# Altium footprint library HoangLong_Library.PcbLib: 81 footprints (part 5 of 6)
Each footprint in its own frame and in the unit in brackets; x right, y up, seen from the top. Pads: shape width x height; smd on the part's side, far side on the other; paste and mask are expansions set on the pad; w line width, h text height; cw(c..) or ccw(c..) is an arc to the next point about the centre after c.
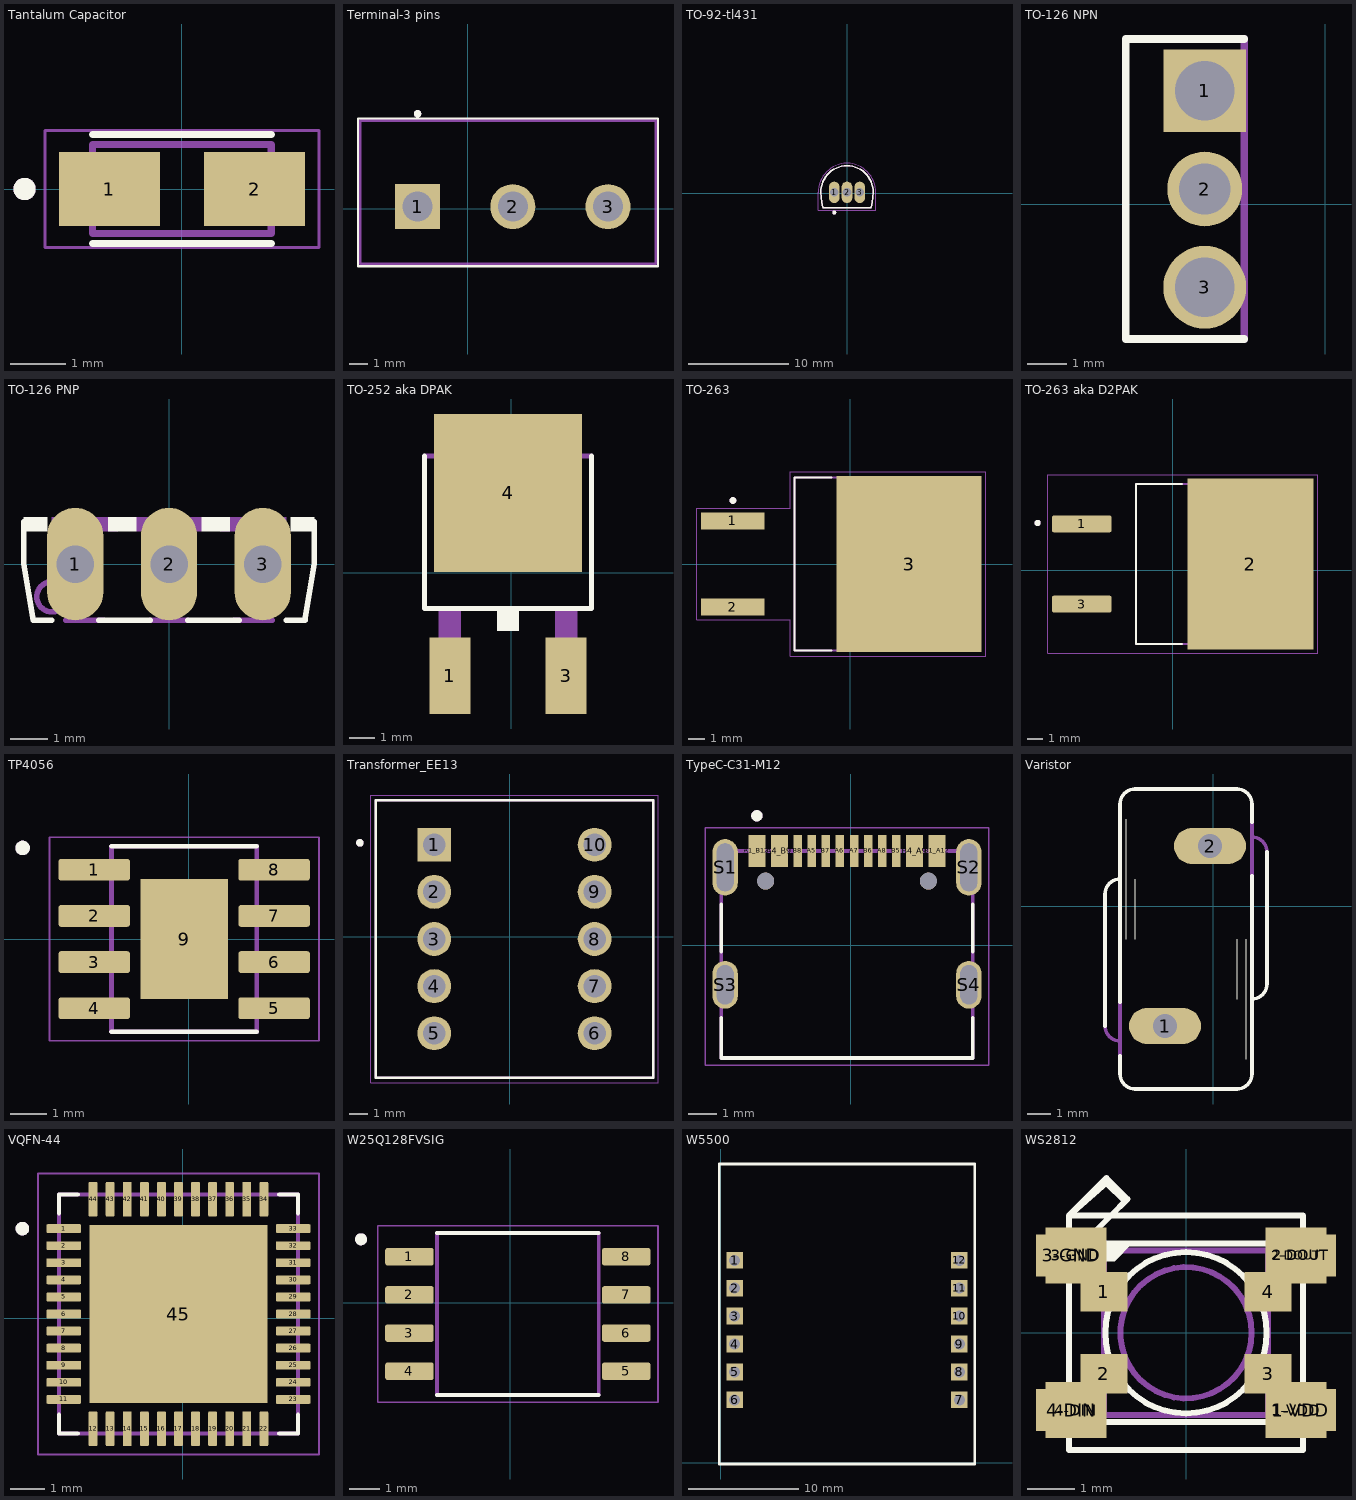
[diagram p4: the footprints below, top view; thin cyan lines are the x and y axes]

## Tantalum Capacitor [mm]
pads (2):
  rect 1.81x1.32 smd: 1(-1.3,0) 2(1.3,0)
Top Overlay:
  circle w0.2: c-2.82,0 r0.1
  lines w0.127: -1.6,-0.98 1.6,-0.98 ; -1.6,0.98 1.6,0.98
Mechanical 13:
  circle w0.2: c-2.82,0 r0.1
  lines w0.127: -1.6,-0.8 -1.6,0.8 1.6,0.8 1.6,-0.8 -1.6,-0.8
Mechanical 15:
  lines w0.051: -2.455,-1.05 2.455,-1.05 2.455,1.05 -2.455,1.05 -2.455,-1.05
3D body "TPSA225K010R1800.STEP": height 1.8, standoff 0, extent -1.6,-0.762 1.6,0.838

## Terminal-3 pins [mm]
pads (3):
  rect 2.4x2.4 / inner round 2.4 / far side rect 2.4x2.4 hole 1.6: 1(-2.667,0.127)
  round 2.4 hole 1.6: 2(2.413,0.127) 3(7.493,0.127)
Top Overlay:
  circle w0.2: c-2.667,5.08 r0.1
  lines w0.127: -5.842,-3.048 -5.842,4.826 10.16,4.826 10.16,-3.048 -5.842,-3.048
Mechanical 13:
  circle w0.2: c-2.667,5.08 r0.1
  lines w0.127: -5.715,-2.921 10.033,-2.921 10.033,4.699 -5.715,4.699 -5.715,-2.921
Mechanical 15:
  lines w0.05: -5.842,-3.048 -5.842,4.826 10.16,4.826 10.16,-3.048 -5.842,-3.048
3D body "DG306-5.0-03P-12-00AH.STEP": height 10.2, standoff -3.7, extent -5.641,-2.921 9.959,4.679

## TO-92-tl431 [mm]
pads (3):
  oval 1.07x2.14 hole 0.85: 1(-1.27,0.06) 2(0,0.06) 3(1.27,0.06)
Top Overlay:
  circle w0.2: c-1.27,-1.94 r0.1
  lines w0.127: -2.606,0.093 ccw(c6.178,0.4) -2.42,-1.427 ; -2.605,0.046 cw(c0.032,0.092) -0.014,2.73 ; -2.412,-1.46 2.412,-1.46 ; 0.014,2.73 cw(c-0.032,0.092) 2.605,0.046 ; 2.42,-1.427 ccw(c-6.178,0.4) 2.606,0.093
Mechanical 13:
  circle w0.2: c-1.27,-1.94 r0.1
  lines w0.127: -2.606,0.093 ccw(c6.178,0.4) -2.42,-1.427 ; -2.605,0.046 cw(c0.032,0.092) -0.014,2.73 ; -2.412,-1.46 2.412,-1.46 ; 0.014,2.73 cw(c-0.032,0.092) 2.605,0.046 ; 2.42,-1.427 ccw(c-6.178,0.4) 2.606,0.093
Mechanical 15:
  lines w0.05: -2.855,0.042 cw(c0.032,0.092) -0.018,2.98 ; -2.855,0.06 -2.855,-1.71 2.855,-1.71 2.855,0.06 ; 0.018,2.98 cw(c-0.032,0.092) 2.855,0.042
3D body "step_temp.STEP": height 5.33, standoff -12.7, extent -2.6,-1.465 2.6,2.728

## TO-126 NPN [mm]
pads (3):
  rect 2.1x2.1 / inner round 2.1 / far side rect 2.1x2.1 hole 1.5: 1(-3.048,2.871)
  round 1.9 hole 1.3: 2(-3.048,0.381)
  round 2.1 hole 1.5: 3(-3.048,-2.109)
Top Overlay:
  lines w0.2: -2.048,-3.419 -5.048,-3.419 -5.048,4.181 -2.048,4.181
Mechanical 13:
  lines w0.2: -2.048,-3.419 -2.048,4.181
3D body "step_temp.STEP": height 17.45, standoff -10.28, extent -4.478,-3.419 -1.778,4.181

## TO-126 PNP [mil]
pads (3):
  oval 60x120 hole 40: 1(-100,0) 2(0,0) 3(100,0)
Top Overlay:
  region: -130,35 -155,35 -155,50 -130,50
  region: -35,35 -65,35 -65,50 -35,50
  region: 65,35 35,35 35,50 65,50
  region: 155,35 130,35 130,50 155,50
  lines w6: -155,45 -155,0 -145,-60 -125,-60 ; -75,-60 -20,-60 ; 20,-60 75,-60 ; 125,-60 145,-60 155,0 155,45
Mechanical 13:
  circle w6: c-125,-35 r16
  region: -55,35 -125,35 -125,50 -55,50
  region: 35,35 -35,35 -35,50 35,50
  region: 125,35 55,35 55,50 125,50
  lines w6: -110,-60 -70,-60 ; -20,-60 20,-60 ; 70,-60 110,-60
3D body "step_temp.STEP": height 687.01, standoff -404.72, extent -149.61,-63.15 149.61,43.15

## TO-252 aka DPAK [mm]
pads (3):
  rect 1.6x3 smd: 1(-2.407,-4.038) 3(2.153,-4.038)
  rect 5.8x6.2 smd: 4(-0.127,3.142)
Top Overlay:
  region: 0.305,-2.261 -0.559,-2.261 -0.559,-1.499 0.305,-1.499
  lines w0.203: -3.404,4.597 -3.404,-1.397 3.15,-1.397 3.15,4.597
Mechanical 13:
  region: 2.438,5.41 2.438,4.699 -2.692,4.699 -2.692,5.41 -2.235,5.867 1.981,5.867
  region: 2.591,-4.394 1.727,-4.394 1.727,-1.499 2.591,-1.499
  region: -1.981,-4.394 -2.845,-4.394 -2.845,-1.499 -1.981,-1.499
  lines w0.203: -3.404,4.597 3.15,4.597 ; -2.692,4.699 2.438,4.699 2.438,5.41 1.981,5.867 -2.235,5.867 -2.692,5.41 -2.692,4.699
3D body "step_temp.STEP": height 2.4, standoff 0, extent -3.377,-4.064 3.123,5.661

## TO-263 [mm]
pads (3):
  rect 3.74x1.02 smd: 1(-6.918,2.54) 2(-6.918,-2.54)
  rect 8.56x10.37 smd paste-6: 3(3.492,0)
Top Overlay:
  circle w0.2: c-6.918,3.75 r0.1
  lines w0.127: -1.101,-5.1 -3.28,-5.1 -3.28,5.1 -1.101,5.1
Top Paste:
  region: 7.342,-0.695 6.062,-0.695 6.062,0.695 7.342,0.695
  region: 7.342,1.385 6.062,1.385 6.062,2.775 7.342,2.775
  region: 7.342,3.465 6.062,3.465 6.062,4.855 7.342,4.855
  region: 7.342,-2.775 6.062,-2.775 6.062,-1.385 7.342,-1.385
  region: 7.342,-4.855 6.062,-4.855 6.062,-3.465 7.342,-3.465
  region: 5.202,-0.695 3.922,-0.695 3.922,0.695 5.202,0.695
  region: 5.202,1.385 3.922,1.385 3.922,2.775 5.202,2.775
  region: 5.202,3.465 3.922,3.465 3.922,4.855 5.202,4.855
  region: 5.202,-2.775 3.922,-2.775 3.922,-1.385 5.202,-1.385
  region: 5.202,-4.855 3.922,-4.855 3.922,-3.465 5.202,-3.465
  region: 3.062,-0.695 1.782,-0.695 1.782,0.695 3.062,0.695
  region: 3.062,1.385 1.782,1.385 1.782,2.775 3.062,2.775
  region: 3.062,3.465 1.782,3.465 1.782,4.855 3.062,4.855
  region: 3.062,-2.775 1.782,-2.775 1.782,-1.385 3.062,-1.385
  region: 3.062,-4.855 1.782,-4.855 1.782,-3.465 3.062,-3.465
  region: 0.922,-0.695 -0.358,-0.695 -0.358,0.695 0.922,0.695
  region: 0.922,1.385 -0.358,1.385 -0.358,2.775 0.922,2.775
  region: 0.922,3.465 -0.358,3.465 -0.358,4.855 0.922,4.855
  region: 0.922,-2.775 -0.358,-2.775 -0.358,-1.385 0.922,-1.385
  region: 0.922,-4.855 -0.358,-4.855 -0.358,-3.465 0.922,-3.465
Mechanical 13:
  circle w0.2: c-6.918,3.75 r0.1
  lines w0.127: -3.28,-5.1 5.87,-5.1 5.87,5.1 -3.28,5.1 -3.28,-5.1
Mechanical 15:
  lines w0.05: -9.038,-3.3 -3.531,-3.3 -3.531,-5.435 8.022,-5.435 8.022,5.435 -3.531,5.435 -3.531,3.3 -9.038,3.3 -9.038,-3.3
3D body "step_temp.STEP": height 4.6, standoff -0.23, extent -8.22,-5.1 7.204,5.1

## TO-263 aka D2PAK [mm]
pads (3):
  rrect25% 3.78x1.06 smd: 1(-5.765,2.921) 3(-5.765,-2.159)
  rect 8x10.84 smd paste-6: 2(4.925,0.381)
Top Overlay:
  circle w0.2: c-8.565,2.981 r0.1
  lines w0.127: 0.585,-4.699 -2.315,-4.699 -2.315,5.461 0.585,5.461
Top Paste:
  region: 5.7,0.661 4.15,0.661 4.15,1.911 5.7,1.911
  region: 5.7,-1.149 4.15,-1.149 4.15,0.101 5.7,0.101
  region: 5.7,-2.959 4.15,-2.959 4.15,-1.709 5.7,-1.709
  region: 5.7,-4.769 4.15,-4.769 4.15,-3.519 5.7,-3.519
  region: 5.7,2.471 4.15,2.471 4.15,3.721 5.7,3.721
  region: 5.7,4.281 4.15,4.281 4.15,5.531 5.7,5.531
  region: 3.03,4.281 1.48,4.281 1.48,5.531 3.03,5.531
  region: 3.03,2.471 1.48,2.471 1.48,3.721 3.03,3.721
  region: 3.03,0.661 1.48,0.661 1.48,1.911 3.03,1.911
  region: 3.03,-1.149 1.48,-1.149 1.48,0.101 3.03,0.101
  region: 3.03,-2.959 1.48,-2.959 1.48,-1.709 3.03,-1.709
  region: 3.03,-4.769 1.48,-4.769 1.48,-3.519 3.03,-3.519
  region: 8.37,4.281 6.82,4.281 6.82,5.531 8.37,5.531
  region: 8.37,2.471 6.82,2.471 6.82,3.721 8.37,3.721
  region: 8.37,0.661 6.82,0.661 6.82,1.911 8.37,1.911
  region: 8.37,-1.149 6.82,-1.149 6.82,0.101 8.37,0.101
  region: 8.37,-2.959 6.82,-2.959 6.82,-1.709 8.37,-1.709
  region: 8.37,-4.769 6.82,-4.769 6.82,-3.519 8.37,-3.519
Mechanical 13:
  circle w0.2: c-8.565,2.981 r0.1
  lines w0.127: -2.315,-4.699 6.765,-4.699 6.765,5.461 -2.315,5.461 -2.315,-4.699
Mechanical 15:
  lines w0.05: -7.905,-5.289 9.175,-5.289 9.175,6.051 -7.905,6.051 -7.905,-5.289
3D body "step_temp.STEP": height 4.83, standoff -0.25, extent -6.985,-4.699 8.255,5.461

## TP4056 [mm]
pads (9):
  rrect25% 1.97x0.6 smd: 1(-2.602,1.905) 2(-2.602,0.635) 3(-2.602,-0.635) 4(-2.602,-1.905) 5(2.348,-1.905) 6(2.348,-0.635) 7(2.348,0.635) 8(2.348,1.905)
  rect 2.413x3.302 smd paste-3: 9(-0.127,0)
Top Overlay:
  circle w0.2: c-4.572,2.505 r0.1
  lines w0.127: -2.127,-2.55 1.873,-2.55 ; -2.127,2.55 1.873,2.55
Top Paste:
  region: 0.518,-0.82 -0.772,-0.82 -0.772,0.82 0.518,0.82
Mechanical 13:
  circle w0.2: c-4.572,2.505 r0.1
  lines w0.127: -2.127,-2.55 1.873,-2.55 1.873,2.55 -2.127,2.55 -2.127,-2.55
Mechanical 15:
  lines w0.05: -3.837,-2.8 3.583,-2.8 3.583,2.8 -3.837,2.8 -3.837,-2.8
3D body "step_temp.STEP": height 1.75, standoff 0, extent -3.127,-2.45 2.873,2.45

## Transformer_EE13 [mm]
pads (10):
  rect 1.8x1.8 hole 1.2: 1(-4.001,4.873)
  round 1.8 hole 1.2: 2(-4.001,2.373) 3(-4.001,-0.127) 4(-4.001,-2.627) 5(-4.001,-5.127) 6(4.509,-5.127) 7(4.509,-2.627) 8(4.509,-0.127) 9(4.509,2.373) 10(4.509,4.873)
Top Overlay:
  circle w0.2: c-7.946,4.973 r0.1
  lines w0.127: -7.111,-7.492 7.619,-7.492 7.619,7.238 -7.111,7.238 -7.111,-7.492
Mechanical 13:
  circle w0.2: c-7.946,4.973 r0.1
  lines w0.127: -7.111,-7.492 -7.111,7.238 7.619,7.238 7.619,-7.492 -7.111,-7.492
Mechanical 15:
  lines w0.05: -7.361,-7.742 -7.361,7.488 7.869,7.488 7.869,-7.742 -7.361,-7.742
3D body "6--3DModel-STEP-56544.STEP": height 15.24, standoff -3.3, extent -7.112,-7.493 7.62,7.239

## TypeC-C31-M12 [mm]
pads (18):
  rect 0.6x1.14 smd mask+0.05: A1_B12(-3.327,3.353) A4_B9(-2.527,3.353) B1_A12(3.073,3.353) B4_A9(2.273,3.353)
  rect 0.3x1.14 smd mask+0.05: A5(-1.377,3.353) A6(-0.377,3.353) A7(0.123,3.353) A8(1.123,3.353) B5(1.623,3.353) B6(0.623,3.353) B7(-0.877,3.353) B8(-1.877,3.353)
  oval 0.9x2 hole 0.6 slot 1.7 at 90 deg: S1(-4.452,2.773) S2(4.198,2.773)
  oval 0.9x1.7 hole 0.6 slot 1.4 at 90 deg: S3(-4.452,-1.397) S4(4.198,-1.397)
  round 0.6 hole 0.6 unplated: ""(-3.017,2.283) ""(2.763,2.283)
Top Overlay:
  circle w0.2: c-3.327,4.603 r0.1
  lines w0.127: -4.597,-2.567 -4.597,-3.997 4.343,-3.997 4.343,-2.567 ; -4.597,-0.227 -4.597,1.453 ; 4.343,-0.227 4.343,1.453
Mechanical 13:
  circle w0.2: c-3.327,4.603 r0.1
  lines w0.127: -4.597,-3.997 4.343,-3.997 4.343,3.353 -4.597,3.353 -4.597,-3.997
Mechanical 15:
  lines w0.05: -5.152,-4.247 -5.152,4.173 4.898,4.173 4.898,-4.247 -5.152,-4.247
3D body "step_temp.STEP": height 3.31, standoff -0.99, extent -4.597,-3.997 4.343,3.908

## Varistor [mil]
pads (2):
  oval 120x60 hole 40: 1(-80,-200) 2(-5,100)
Top Overlay:
  lines w2: -145,-55 -145,145 ; -130,-55 -130,45 ; 40,-155 40,-55 ; 55,-255 55,-55
  lines w6: -180,-200 -180,20 cw(c-155,20) -155,45 ; -155,-250 -155,-280 ccw(c-130,-280) -130,-305 40,-305 ccw(c40,-280) 65,-280 65,50 ; -155,-160 -155,170 cw(c-130,170) -130,195 40,195 cw(c40,170) 65,170 65,140 ; 65,-155 ccw(c65,-130) 90,-130 90,90
Mechanical 13:
  lines w6: -180,-200 ccw(c-155,-200) -155,-225 ; -155,-250 -155,-160 ; 65,50 65,140 ; 65,115 cw(c65,90) 90,90
3D body "step_temp.STEP": height 610.24, standoff -669.29, extent -123.74,-296.06 33.74,196.06

## VQFN-44 [mm]
pads (45):
  rrect25% 1.01x0.26 smd: 1(-3.487,2.627) 2(-3.487,2.127) 3(-3.487,1.627) 4(-3.487,1.127) 5(-3.487,0.627) 6(-3.487,0.127) 7(-3.487,-0.373) 8(-3.487,-0.873) 9(-3.487,-1.373) 10(-3.487,-1.873) 11(-3.487,-2.373) 23(3.233,-2.373) 24(3.233,-1.873) 25(3.233,-1.373) 26(3.233,-0.873) 27(3.233,-0.373) 28(3.233,0.127) 29(3.233,0.627) 30(3.233,1.127) 31(3.233,1.627) 32(3.233,2.127) 33(3.233,2.627)
  rrect25% 0.26x1.01 smd: 12(-2.627,-3.233) 13(-2.127,-3.233) 14(-1.627,-3.233) 15(-1.127,-3.233) 16(-0.627,-3.233) 17(-0.127,-3.233) 18(0.373,-3.233) 19(0.873,-3.233) 20(1.373,-3.233) 21(1.873,-3.233) 22(2.373,-3.233) 34(2.373,3.487) 35(1.873,3.487) 36(1.373,3.487) 37(0.873,3.487) 38(0.373,3.487) 39(-0.127,3.487) 40(-0.627,3.487) 41(-1.127,3.487) 42(-1.627,3.487) 43(-2.127,3.487) 44(-2.627,3.487)
  rect 5.2x5.2 smd paste-4: 45(-0.127,0.127)
Top Overlay:
  circle w0.2: c-4.697,2.627 r0.1
  lines w0.127: -3.627,-2.823 -3.627,-3.373 -3.077,-3.373 ; -3.627,3.077 -3.627,3.627 -3.077,3.627 ; 2.823,-3.373 3.373,-3.373 3.373,-2.823 ; 2.823,3.627 3.373,3.627 3.373,3.077
Top Paste:
  region: -0.607,0.607 -2.247,0.607 -2.247,2.247 -0.607,2.247
  region: 1.993,0.607 0.353,0.607 0.353,2.247 1.993,2.247
  region: -0.607,-1.993 -2.247,-1.993 -2.247,-0.353 -0.607,-0.353
  region: 1.993,-1.993 0.353,-1.993 0.353,-0.353 1.993,-0.353
Mechanical 13:
  circle w0.2: c-4.697,2.627 r0.1
  lines w0.127: -3.627,-3.373 3.373,-3.373 3.373,3.627 -3.627,3.627 -3.627,-3.373
Mechanical 15:
  lines w0.05: -4.242,-3.988 3.988,-3.988 3.988,4.242 -4.242,4.242 -4.242,-3.988
3D body "step_temp.STEP": height 1, standoff 0, extent -3.627,-3.373 3.373,3.627

## W25Q128FVSIG [mm]
pads (8):
  rrect25% 1.61x0.58 smd: 1(-3.351,1.524) 2(-3.351,0.254) 3(-3.351,-1.016) 4(-3.351,-2.286) 5(3.859,-2.286) 6(3.859,-1.016) 7(3.859,0.254) 8(3.859,1.524)
Top Overlay:
  circle w0.2: c-4.961,2.104 r0.1
  lines w0.127: -2.436,-3.071 2.944,-3.071 ; -2.436,2.309 2.944,2.309
Mechanical 13:
  circle w0.2: c-4.961,2.104 r0.1
  lines w0.127: -2.436,-3.071 -2.436,2.309 2.944,2.309 2.944,-3.071 -2.436,-3.071
Mechanical 15:
  lines w0.05: -4.406,-3.321 -4.406,2.559 4.914,2.559 4.914,-3.321 -4.406,-3.321
3D body "step_temp.STEP": height 2.16, standoff 0, extent -3.696,-3.021 4.204,2.259

## W5500 [mil]
pads (12):
  rect 60x60 hole 39.37: 1(50,725) 2(50,625) 3(50,525) 4(50,425) 5(50,325) 6(50,225) 7(855,225) 8(855,325) 9(855,425) 10(855,525) 11(855,625) 12(855,725)
Top Overlay:
  lines w10: -5,-5 910,-5 910,1070 -5,1070 -5,-5
3D body "W5500 mini Module.stp": height 796.3, standoff -160, extent -0.51,-3.46 905,1063.46

## WS2812 [mm]
pads (12):
  rect 1x0.85 smd: 1(-1.75,0.875) 2(-1.75,-0.875) 3(1.75,-0.875) 4(1.75,0.875)
  rect 1.3x1.2 smd: 1-VDD(2.35,-1.65) 2-DOUT(2.35,1.65) 3-GND(-2.35,1.65) 4-DIN(-2.35,-1.65)
  rect 1.5x0.9 smd: 1-VDD(2.45,-1.65) 2-DOUT(2.45,1.65) 3-GND(-2.45,1.65) 4-DIN(-2.45,-1.65)
Top Overlay:
  circle w0.127: c0,0 r1.72
  circle w0.127: c0,0 r1.72
  region: -1.524,1.524 -1.905,1.524 -1.905,1.905 -1.143,1.905
  lines w0.127: -1.9,-1.6 -1.9,-1.9 1.9,-1.9 1.9,-1.6 ; -1.9,1.6 -1.9,1.9 1.9,1.9 1.9,1.6 ; -2.5,-2.5 -2.5,1.6 ; -2.5,-2.5 2.5,-2.5 ; -2.5,-2.5 -2.5,1.6 ; -2.5,-2.5 2.5,-2.5 ; -2.5,1.6 -1.6,2.5 ; -2.5,1.6 -2.5,2.5 ; -2.5,1.6 -1.6,2.5 ; -2.5,1.6 -2.5,2.5 ; -2.5,2.5 -1.7,3.3 -1.25,2.85 -1.6,2.5 ; -2.5,2.5 -1.6,2.5 ; -2.5,2.5 -1.7,3.2 -1.3,2.8 -1.6,2.5 ; -2.5,2.5 -1.6,2.5 ; -1.6,2.5 2.5,2.5 ; -1.6,2.5 2.5,2.5 ; 2.5,-2.5 2.5,2.5 ; 2.5,-2.5 2.5,2.5
Mechanical 13:
  circle w0.127: c0,0 r1.4
  lines w0.127: -1.75,-1.75 -1.75,1.75 1.75,1.75 1.75,-1.75 -1.75,-1.75
3D body "WS2812B--3DModel-STEP-510211.STEP": height 1.62, standoff 0, extent -2.7,-2.5 2.7,2.5